# Altium footprint library ref-packages.PCBLIB: 1543 footprints (part 84 of 103)
Each footprint in its own frame and in the unit in brackets; x right, y up, seen from the top. Pads: shape width x height; smd on the part's side, far side on the other; paste and mask are expansions set on the pad; w line width, h text height; cw(c..) or ccw(c..) is an arc to the next point about the centre after c.
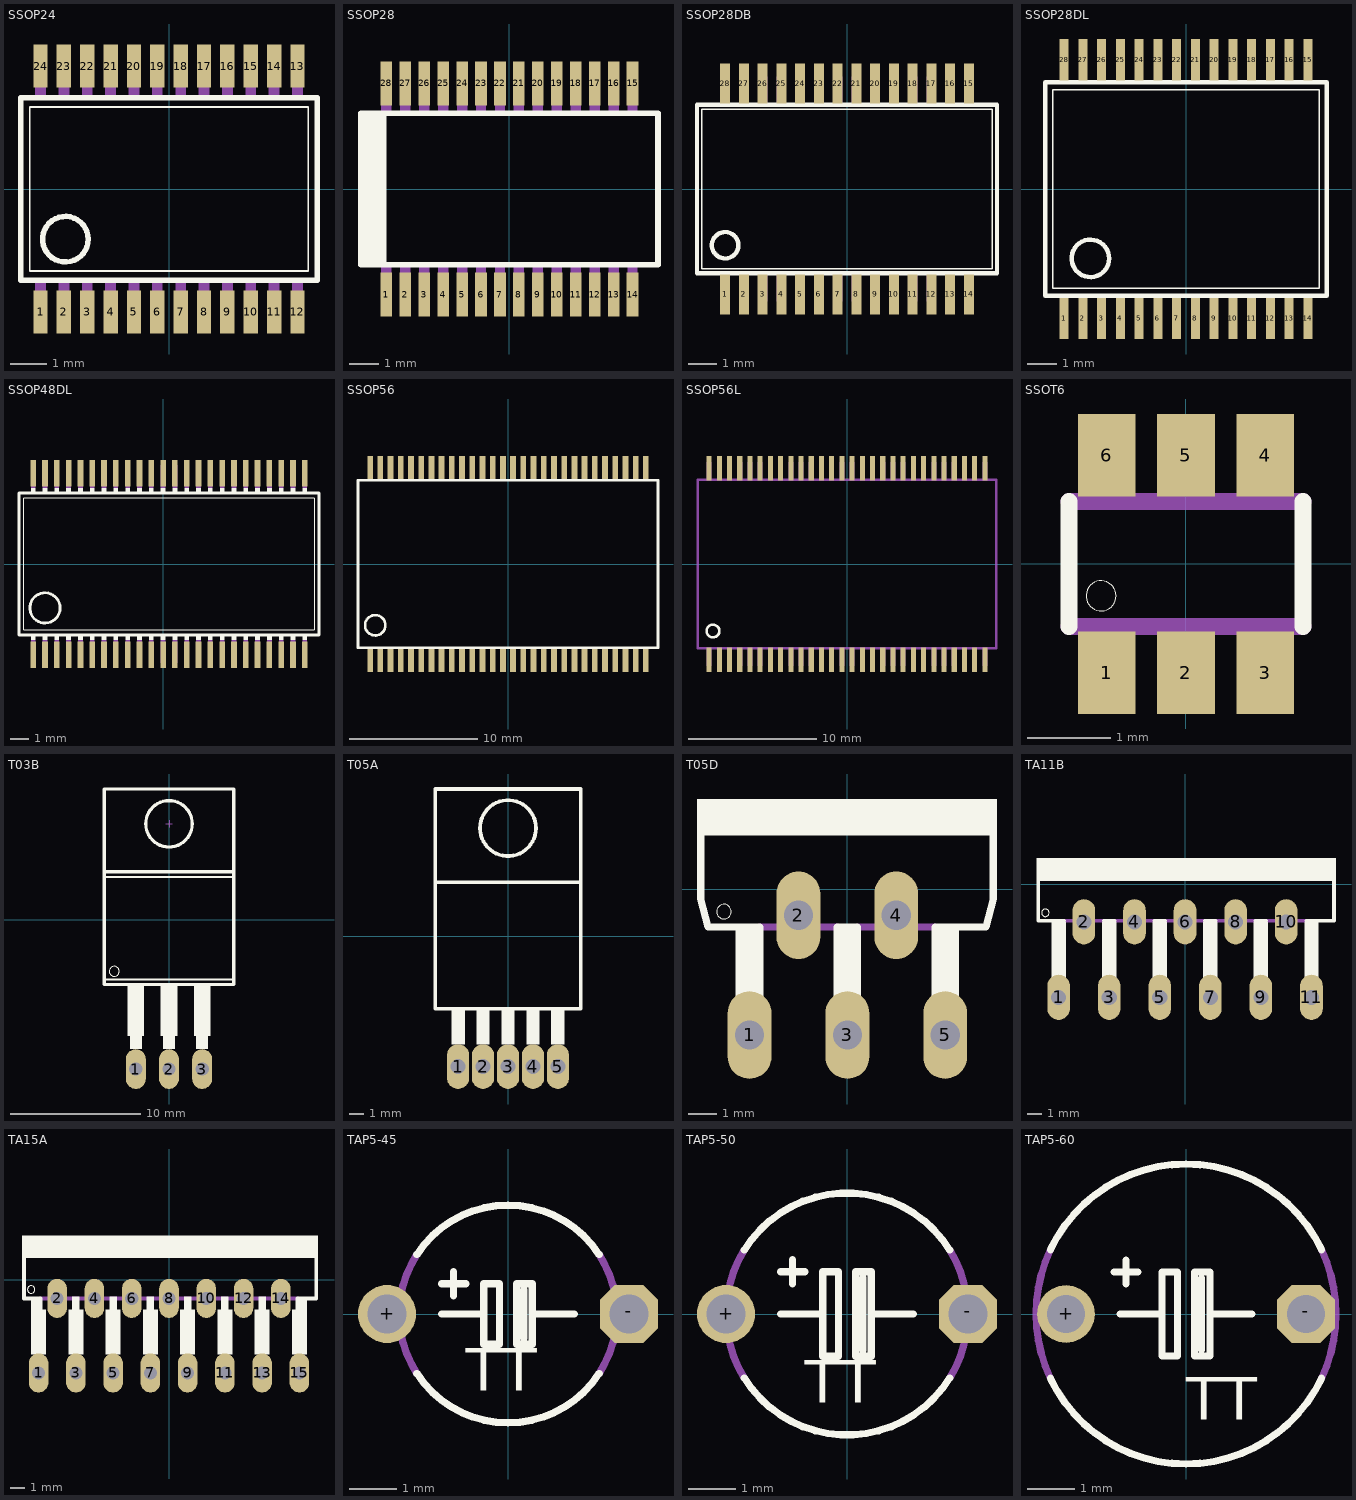
[diagram p83: the footprints below, top view; thin cyan lines are the x and y axes]

## SSOP24 [mil]
pads (24):
  rect 15.75x47.24 smd: 1(-140.75,-134.65) 2(-115.16,-134.65) 3(-89.57,-134.65) 4(-63.98,-134.65) 5(-38.39,-134.65) 6(-12.8,-134.65) 7(12.8,-134.65) 8(38.39,-134.65) 9(63.98,-134.65) 10(89.57,-134.65) 11(115.16,-134.65) 12(140.75,-134.65) 13(140.75,134.65) 14(115.16,134.65) 15(89.57,134.65) 16(63.98,134.65) 17(38.39,134.65) 18(12.8,134.65) 19(-12.8,134.65) 20(-38.39,134.65) 21(-63.98,134.65) 22(-89.57,134.65) 23(-115.16,134.65) 24(-140.75,134.65)
Top Overlay:
  circle w6: c-113.5,-55 r25
  lines w2: -152.52,-90 152.52,-90 152.52,90 -152.52,90 -152.52,-90
  lines w6: -162.52,-99.84 162.52,-99.84 162.52,99.84 -162.52,99.84 -162.52,-99.84
Mechanical 16:
  rectangle: -146.65,-149.61 -134.84,-102.36
  rectangle: -121.06,-149.61 -109.25,-102.36
  rectangle: -95.47,-149.61 -83.66,-102.36
  rectangle: -69.88,-149.61 -58.07,-102.36
  rectangle: -44.29,-149.61 -32.48,-102.36
  rectangle: -18.7,-149.61 -6.89,-102.36
  rectangle: 6.89,-149.61 18.7,-102.36
  rectangle: 32.48,-149.61 44.29,-102.36
  rectangle: 58.07,-149.61 69.88,-102.36
  rectangle: 83.66,-149.61 95.47,-102.36
  rectangle: 109.25,-149.61 121.06,-102.36
  rectangle: 134.84,-149.61 146.65,-102.36
  rectangle: 134.84,102.36 146.65,149.61
  rectangle: 109.25,102.36 121.06,149.61
  rectangle: 83.66,102.36 95.47,149.61
  rectangle: 58.07,102.36 69.88,149.61
  rectangle: 32.48,102.36 44.29,149.61
  rectangle: 6.89,102.36 18.7,149.61
  rectangle: -18.7,102.36 -6.89,149.61
  rectangle: -44.29,102.36 -32.48,149.61
  rectangle: -69.88,102.36 -58.07,149.61
  rectangle: -95.47,102.36 -83.66,149.61
  rectangle: -121.06,102.36 -109.25,149.61
  rectangle: -146.65,102.36 -134.84,149.61

## SSOP28 [mil]
pads (28):
  rect 15.75x59.06 smd: 1(-166.34,-142.72) 2(-140.75,-142.72) 3(-115.16,-142.72) 4(-89.57,-142.72) 5(-63.98,-142.72) 6(-38.39,-142.72) 7(-12.8,-142.72) 8(12.8,-142.72) 9(38.39,-142.72) 10(63.98,-142.72) 11(89.57,-142.72) 12(115.16,-142.72) 13(140.75,-142.72) 14(166.34,-142.72) 15(166.34,142.72) 16(140.75,142.72) 17(115.16,142.72) 18(89.57,142.72) 19(63.98,142.72) 20(38.39,142.72) 21(12.8,142.72) 22(-12.8,142.72) 23(-38.39,142.72) 24(-63.98,142.72) 25(-89.57,142.72) 26(-115.16,142.72) 27(-140.75,142.72) 28(-166.34,142.72)
Top Overlay:
  rectangle: -204.72,-102.36 -166.34,102.36
  lines w8: -200.79,-102.36 200.79,-102.36 200.79,102.36 -200.79,102.36
Mechanical 16:
  rectangle: -173.34,-155 -159.34,-104
  rectangle: -147.75,-155 -133.75,-104
  rectangle: -122.16,-155 -108.16,-104
  rectangle: -96.57,-155 -82.57,-104
  rectangle: -70.98,-155 -56.98,-104
  rectangle: -45.39,-155 -31.39,-104
  rectangle: -19.8,-155 -5.8,-104
  rectangle: 5.8,-155 19.8,-104
  rectangle: 31.39,-155 45.39,-104
  rectangle: 56.98,-155 70.98,-104
  rectangle: 82.57,-155 96.57,-104
  rectangle: 108.16,-155 122.16,-104
  rectangle: 133.75,-155 147.75,-104
  rectangle: 159.34,-155 173.34,-104
  rectangle: 159.34,104 173.34,155
  rectangle: 133.75,104 147.75,155
  rectangle: 108.16,104 122.16,155
  rectangle: 82.57,104 96.57,155
  rectangle: 56.98,104 70.98,155
  rectangle: 31.39,104 45.39,155
  rectangle: 5.8,104 19.8,155
  rectangle: -19.8,104 -5.8,155
  rectangle: -45.39,104 -31.39,155
  rectangle: -70.98,104 -56.98,155
  rectangle: -96.57,104 -82.57,155
  rectangle: -122.16,104 -108.16,155
  rectangle: -147.75,104 -133.75,155
  rectangle: -173.34,104 -159.34,155

## SSOP28DB [mil]
pads (28):
  rect 13.7x55 smd: 1(-166.34,-143.94) 2(-140.75,-143.94) 3(-115.16,-143.94) 4(-89.57,-143.94) 5(-63.98,-143.94) 6(-38.39,-143.94) 7(-12.8,-143.94) 8(12.8,-143.94) 9(38.39,-143.94) 10(63.98,-143.94) 11(89.57,-143.94) 12(115.16,-143.94) 13(140.75,-143.94) 14(166.34,-143.94) 15(166.34,143.94) 16(140.75,143.94) 17(115.16,143.94) 18(89.57,143.94) 19(63.98,143.94) 20(38.39,143.94) 21(12.8,143.94) 22(-12.8,143.94) 23(-38.39,143.94) 24(-63.98,143.94) 25(-89.57,143.94) 26(-115.16,143.94) 27(-140.75,143.94) 28(-166.34,143.94)
Top Overlay:
  circle w6: c-166.34,-76.77 r18.09
  lines w2: -198.35,-108.78 198.35,-108.78 198.35,108.78 -198.35,108.78 -198.35,-108.78
  lines w6: -204.72,-115.16 204.72,-115.16 204.72,115.16 -204.72,115.16 -204.72,-115.16
Mechanical 16:
  rectangle: -172.74,116.76 -159.94,153.54
  rectangle: -172.74,-153.54 -159.94,-116.76
  rectangle: -147.15,-153.54 -134.35,-116.76
  rectangle: -121.56,-153.54 -108.76,-116.76
  rectangle: -147.15,116.76 -134.35,153.54
  rectangle: -121.56,116.76 -108.76,153.54
  rectangle: -95.96,116.76 -83.17,153.54
  rectangle: -70.37,116.76 -57.58,153.54
  rectangle: -44.78,116.76 -31.99,153.54
  rectangle: -19.19,116.76 -6.4,153.54
  rectangle: 6.4,116.76 19.19,153.54
  rectangle: 31.99,116.76 44.78,153.54
  rectangle: 57.58,116.76 70.37,153.54
  rectangle: 83.17,116.76 95.96,153.54
  rectangle: 108.76,116.76 121.56,153.54
  rectangle: 134.35,116.76 147.15,153.54
  rectangle: 159.94,116.76 172.74,153.54
  rectangle: -95.96,-153.54 -83.17,-116.76
  rectangle: -70.37,-153.54 -57.58,-116.76
  rectangle: -44.78,-153.54 -31.99,-116.76
  rectangle: -19.19,-153.54 -6.4,-116.76
  rectangle: 6.4,-153.54 19.19,-116.76
  rectangle: 31.99,-153.54 44.78,-116.76
  rectangle: 57.58,-153.54 70.37,-116.76
  rectangle: 83.17,-153.54 95.96,-116.76
  rectangle: 108.76,-153.54 121.56,-116.76
  rectangle: 134.35,-153.54 147.15,-116.76
  rectangle: 159.94,-153.54 172.74,-116.76

## SSOP28DL [mil]
pads (28):
  rect 12x55 smd: 1(-162.5,-172.5) 2(-137.5,-172.5) 3(-112.5,-172.5) 4(-87.5,-172.5) 5(-62.5,-172.5) 6(-37.5,-172.5) 7(-12.5,-172.5) 8(12.5,-172.5) 9(37.5,-172.5) 10(62.5,-172.5) 11(87.5,-172.5) 12(112.5,-172.5) 13(137.5,-172.5) 14(162.5,-172.5) 15(162.5,172.5) 16(137.5,172.5) 17(112.5,172.5) 18(87.5,172.5) 19(62.5,172.5) 20(37.5,172.5) 21(12.5,172.5) 22(-12.5,172.5) 23(-37.5,172.5) 24(-62.5,172.5) 25(-87.5,172.5) 26(-112.5,172.5) 27(-137.5,172.5) 28(-162.5,172.5)
Top Overlay:
  circle w6: c-127.5,-92.5 r25
  lines w2: -177.52,-132.52 177.52,-132.52 177.52,132.52 -177.52,132.52 -177.52,-132.52
  lines w6: -187.52,-142.52 187.52,-142.52 187.52,142.52 -187.52,142.52 -187.52,-142.52
Mechanical 16:
  rectangle: -166.5,144.5 -158.5,177.5
  rectangle: -141.5,144.5 -133.5,177.5
  rectangle: -116.5,144.5 -108.5,177.5
  rectangle: -91.5,144.5 -83.5,177.5
  rectangle: -66.5,144.5 -58.5,177.5
  rectangle: -41.5,144.5 -33.5,177.5
  rectangle: -16.5,144.5 -8.5,177.5
  rectangle: 8.5,144.5 16.5,177.5
  rectangle: 33.5,144.5 41.5,177.5
  rectangle: 58.5,144.5 66.5,177.5
  rectangle: 83.5,144.5 91.5,177.5
  rectangle: 108.5,144.5 116.5,177.5
  rectangle: 133.5,144.5 141.5,177.5
  rectangle: 158.5,144.5 166.5,177.5
  rectangle: 158.5,-177.5 166.5,-144.5
  rectangle: 133.5,-177.5 141.5,-144.5
  rectangle: 108.5,-177.5 116.5,-144.5
  rectangle: 83.5,-177.5 91.5,-144.5
  rectangle: 58.5,-177.5 66.5,-144.5
  rectangle: 33.5,-177.5 41.5,-144.5
  rectangle: 8.5,-177.5 16.5,-144.5
  rectangle: -16.5,-177.5 -8.5,-144.5
  rectangle: -41.5,-177.5 -33.5,-144.5
  rectangle: -66.5,-177.5 -58.5,-144.5
  rectangle: -91.5,-177.5 -83.5,-144.5
  rectangle: -116.5,-177.5 -108.5,-144.5
  rectangle: -141.5,-177.5 -133.5,-144.5
  rectangle: -166.5,-177.5 -158.5,-144.5

## SSOP48DL [mil]
pads (48):
  rect 12x56 smd: 1(-275,-192) 2(-250,-192) 3(-225,-192) 4(-200,-192) 5(-175,-192) 6(-150,-192) 7(-125,-192) 8(-100,-192) 9(-75,-192) 10(-50,-192) 11(-25,-192) 12(0,-192) 13(25,-192) 14(50,-192) 15(75,-192) 16(100,-192) 17(125,-192) 18(150,-192) 19(175,-192) 20(200,-192) 21(225,-192) 22(250,-192) 23(275,-192) 24(300,-192) 25(300,192) 26(275,192) 27(250,192) 28(225,192) 29(200,192) 30(175,192) 31(150,192) 32(125,192) 33(100,192) 34(75,192) 35(50,192) 36(25,192) 37(0,192) 38(-25,192) 39(-50,192) 40(-75,192) 41(-100,192) 42(-125,192) 43(-150,192) 44(-175,192) 45(-200,192) 46(-225,192) 47(-250,192) 48(-275,192)
Top Overlay:
  circle w6: c-250,-93 r32
  rectangle: -5,-161 5,-150
  rectangle: 20,-161 30,-150
  rectangle: 45,-161 55,-150
  rectangle: 70,-161 80,-150
  rectangle: 95,-161 105,-150
  rectangle: 120,-161 130,-150
  rectangle: 145,-161 155,-150
  rectangle: 170,-161 180,-150
  rectangle: 195,-161 205,-150
  rectangle: 220,-161 230,-150
  rectangle: 245,-161 255,-150
  rectangle: 270,-161 280,-150
  rectangle: -30,-161 -20,-150
  rectangle: -55,-161 -45,-150
  rectangle: -80,-161 -70,-150
  rectangle: -105,-161 -95,-150
  rectangle: -130,-161 -120,-150
  rectangle: -155,-161 -145,-150
  rectangle: -180,-161 -170,-150
  rectangle: -205,-161 -195,-150
  rectangle: -230,-161 -220,-150
  rectangle: -255,-161 -245,-150
  rectangle: -280,-161 -270,-150
  rectangle: -5,150 5,161
  rectangle: -280,150 -270,161
  rectangle: -255,150 -245,161
  rectangle: -230,150 -220,161
  rectangle: -205,150 -195,161
  rectangle: -180,150 -170,161
  rectangle: -155,150 -145,161
  rectangle: -130,150 -120,161
  rectangle: -105,150 -95,161
  rectangle: -80,150 -70,161
  rectangle: -55,150 -45,161
  rectangle: -30,150 -20,161
  rectangle: 20,150 30,161
  rectangle: 45,150 55,161
  rectangle: 70,150 80,161
  rectangle: 95,150 105,161
  rectangle: 120,150 130,161
  rectangle: 145,150 155,161
  rectangle: 170,150 180,161
  rectangle: 195,150 205,161
  rectangle: 220,150 230,161
  rectangle: 245,150 255,161
  rectangle: 270,150 280,161
  rectangle: 295,150 305,161
  rectangle: 295,-161 305,-150
  lines w2: -295,-139 320,-139 320,139 -295,139 -295,-139
  lines w6: -305,-150 330,-150 330,150 -305,150 -305,-150
Mechanical 16:
  rectangle: -5,-210 5,-161
  rectangle: -255,-210 -245,-161
  rectangle: -230,-210 -220,-161
  rectangle: -205,-210 -195,-161
  rectangle: -180,-210 -170,-161
  rectangle: -155,-210 -145,-161
  rectangle: -130,-210 -120,-161
  rectangle: -105,-210 -95,-161
  rectangle: -80,-210 -70,-161
  rectangle: -55,-210 -45,-161
  rectangle: -30,-210 -20,-161
  rectangle: -280,-210 -270,-161
  rectangle: 20,-210 30,-161
  rectangle: 45,-210 55,-161
  rectangle: 70,-210 80,-161
  rectangle: 95,-210 105,-161
  rectangle: 120,-210 130,-161
  rectangle: 145,-210 155,-161
  rectangle: 170,-210 180,-161
  rectangle: 195,-210 205,-161
  rectangle: 220,-210 230,-161
  rectangle: 245,-210 255,-161
  rectangle: 270,-210 280,-161
  rectangle: 295,-210 305,-161
  rectangle: -5,161 5,210
  rectangle: -280,161 -270,210
  rectangle: -255,161 -245,210
  rectangle: -230,161 -220,210
  rectangle: -205,161 -195,210
  rectangle: -180,161 -170,210
  rectangle: -155,161 -145,210
  rectangle: -130,161 -120,210
  rectangle: -105,161 -95,210
  rectangle: -80,161 -70,210
  rectangle: -55,161 -45,210
  rectangle: -30,161 -20,210
  rectangle: 20,161 30,210
  rectangle: 45,161 55,210
  rectangle: 70,161 80,210
  rectangle: 95,161 105,210
  rectangle: 120,161 130,210
  rectangle: 145,161 155,210
  rectangle: 170,161 180,210
  rectangle: 195,161 205,210
  rectangle: 220,161 230,210
  rectangle: 245,161 255,210
  rectangle: 270,161 280,210
  rectangle: 295,161 305,210

## SSOP56 [mm]
pads (56):
  rect 0.45x1.8 smd: 1(-10.8,-7.55) 2(-10,-7.55) 3(-9.2,-7.55) 4(-8.4,-7.55) 5(-7.6,-7.55) 6(-6.8,-7.55) 7(-6,-7.55) 8(-5.2,-7.55) 9(-4.4,-7.55) 10(-3.6,-7.55) 11(-2.8,-7.55) 12(-2,-7.55) 13(-1.2,-7.55) 14(-0.4,-7.55) 15(0.4,-7.55) 16(1.2,-7.55) 17(2,-7.55) 18(2.8,-7.55) 19(3.6,-7.55) 20(4.4,-7.55) 21(5.2,-7.55) 22(6,-7.55) 23(6.8,-7.55) 24(7.6,-7.55) 25(8.4,-7.55) 26(9.2,-7.55) 27(10,-7.55) 28(10.8,-7.55) 29(10.8,7.55) 30(10,7.55) 31(9.2,7.55) 32(8.4,7.55) 33(7.6,7.55) 34(6.8,7.55) 35(6,7.55) 36(5.2,7.55) 37(4.4,7.55) 38(3.6,7.55) 39(2.8,7.55) 40(2,7.55) 41(1.2,7.55) 42(0.4,7.55) 43(-0.4,7.55) 44(-1.2,7.55) 45(-2,7.55) 46(-2.8,7.55) 47(-3.6,7.55) 48(-4.4,7.55) 49(-5.2,7.55) 50(-6,7.55) 51(-6.8,7.55) 52(-7.6,7.55) 53(-8.4,7.55) 54(-9.2,7.55) 55(-10,7.55) 56(-10.8,7.55)
Top Overlay:
  circle w0.203: c-10.4,-4.8 r0.8
  lines w0.203: -11.75,-6.55 11.75,-6.55 11.75,6.55 -11.75,6.55 -11.75,-6.55
Mechanical 16:
  rectangle: -10.95,-8 -10.65,-6.6
  rectangle: -10.15,-8 -9.85,-6.6
  rectangle: -9.35,-8 -9.05,-6.6
  rectangle: -8.55,-8 -8.25,-6.6
  rectangle: -7.75,-8 -7.45,-6.6
  rectangle: -6.95,-8 -6.65,-6.6
  rectangle: -6.15,-8 -5.85,-6.6
  rectangle: -5.35,-8 -5.05,-6.6
  rectangle: -4.55,-8 -4.25,-6.6
  rectangle: -3.75,-8 -3.45,-6.6
  rectangle: -2.95,-8 -2.65,-6.6
  rectangle: -2.15,-8 -1.85,-6.6
  rectangle: -1.35,-8 -1.05,-6.6
  rectangle: -0.55,-8 -0.25,-6.6
  rectangle: 0.25,-8 0.55,-6.6
  rectangle: 1.05,-8 1.35,-6.6
  rectangle: 1.85,-8 2.15,-6.6
  rectangle: 2.65,-8 2.95,-6.6
  rectangle: 3.45,-8 3.75,-6.6
  rectangle: 4.25,-8 4.55,-6.6
  rectangle: 5.05,-8 5.35,-6.6
  rectangle: 5.85,-8 6.15,-6.6
  rectangle: 6.65,-8 6.95,-6.6
  rectangle: 7.45,-8 7.75,-6.6
  rectangle: 8.25,-8 8.55,-6.6
  rectangle: 9.05,-8 9.35,-6.6
  rectangle: 9.85,-8 10.15,-6.6
  rectangle: 10.65,-8 10.95,-6.6
  rectangle: 10.65,6.6 10.95,8
  rectangle: 9.85,6.6 10.15,8
  rectangle: 9.05,6.6 9.35,8
  rectangle: 8.25,6.6 8.55,8
  rectangle: 7.45,6.6 7.75,8
  rectangle: 6.65,6.6 6.95,8
  rectangle: 5.85,6.6 6.15,8
  rectangle: 5.05,6.6 5.35,8
  rectangle: 4.25,6.6 4.55,8
  rectangle: 3.45,6.6 3.75,8
  rectangle: 2.65,6.6 2.95,8
  rectangle: 1.85,6.6 2.15,8
  rectangle: 1.05,6.6 1.35,8
  rectangle: 0.25,6.6 0.55,8
  rectangle: -0.55,6.6 -0.25,8
  rectangle: -1.35,6.6 -1.05,8
  rectangle: -2.15,6.6 -1.85,8
  rectangle: -2.95,6.6 -2.65,8
  rectangle: -3.75,6.6 -3.45,8
  rectangle: -4.55,6.6 -4.25,8
  rectangle: -5.35,6.6 -5.05,8
  rectangle: -6.15,6.6 -5.85,8
  rectangle: -6.95,6.6 -6.65,8
  rectangle: -7.75,6.6 -7.45,8
  rectangle: -8.55,6.6 -8.25,8
  rectangle: -9.35,6.6 -9.05,8
  rectangle: -10.15,6.6 -9.85,8
  rectangle: -10.95,6.6 -10.65,8

## SSOP56L [mm]
pads (56):
  rect 0.4x1.9 smd: 1(-10.8,-7.5) 2(-10,-7.5) 3(-9.2,-7.5) 4(-8.4,-7.5) 5(-7.6,-7.5) 6(-6.8,-7.5) 7(-6,-7.5) 8(-5.2,-7.5) 9(-4.4,-7.5) 10(-3.6,-7.5) 11(-2.8,-7.5) 12(-2,-7.5) 13(-1.2,-7.5) 14(-0.4,-7.5) 15(0.4,-7.5) 16(1.2,-7.5) 17(2,-7.5) 18(2.8,-7.5) 19(3.6,-7.5) 20(4.4,-7.5) 21(5.2,-7.5) 22(6,-7.5) 23(6.8,-7.5) 24(7.6,-7.5) 25(8.4,-7.5) 26(9.2,-7.5) 27(10,-7.5) 28(10.8,-7.5) 29(10.8,7.5) 30(10,7.5) 31(9.2,7.5) 32(8.4,7.5) 33(7.6,7.5) 34(6.8,7.5) 35(6,7.5) 36(5.2,7.5) 37(4.4,7.5) 38(3.6,7.5) 39(2.8,7.5) 40(2,7.5) 41(1.2,7.5) 42(0.4,7.5) 43(-0.4,7.5) 44(-1.2,7.5) 45(-2,7.5) 46(-2.8,7.5) 47(-3.6,7.5) 48(-4.4,7.5) 49(-5.2,7.5) 50(-6,7.5) 51(-6.8,7.5) 52(-7.6,7.5) 53(-8.4,7.5) 54(-9.2,7.5) 55(-10,7.5) 56(-10.8,7.5)
Top Overlay:
  circle w0.203: c-10.5,-5.25 r0.5
Mechanical 16:
  rectangle: -11,-8 -10.6,-6.6
  rectangle: -10.2,-8 -9.8,-6.6
  rectangle: -9.4,-8 -9,-6.6
  rectangle: -8.6,-8 -8.2,-6.6
  rectangle: -7.8,-8 -7.4,-6.6
  rectangle: -7,-8 -6.6,-6.6
  rectangle: -6.2,-8 -5.8,-6.6
  rectangle: -5.4,-8 -5,-6.6
  rectangle: -4.6,-8 -4.2,-6.6
  rectangle: -3.8,-8 -3.4,-6.6
  rectangle: -3,-8 -2.6,-6.6
  rectangle: -2.2,-8 -1.8,-6.6
  rectangle: -1.4,-8 -1,-6.6
  rectangle: -0.6,-8 -0.2,-6.6
  rectangle: 0.2,-8 0.6,-6.6
  rectangle: 1,-8 1.4,-6.6
  rectangle: 1.8,-8 2.2,-6.6
  rectangle: 2.6,-8 3,-6.6
  rectangle: 3.4,-8 3.8,-6.6
  rectangle: 4.2,-8 4.6,-6.6
  rectangle: 5,-8 5.4,-6.6
  rectangle: 5.8,-8 6.2,-6.6
  rectangle: 6.6,-8 7,-6.6
  rectangle: 7.4,-8 7.8,-6.6
  rectangle: 8.2,-8 8.6,-6.6
  rectangle: 9,-8 9.4,-6.6
  rectangle: 9.8,-8 10.2,-6.6
  rectangle: 10.6,-8 11,-6.6
  rectangle: 10.6,6.6 11,8
  rectangle: 9.8,6.6 10.2,8
  rectangle: 9,6.6 9.4,8
  rectangle: 8.2,6.6 8.6,8
  rectangle: 7.4,6.6 7.8,8
  rectangle: 6.6,6.6 7,8
  rectangle: 5.8,6.6 6.2,8
  rectangle: 5,6.6 5.4,8
  rectangle: 4.2,6.6 4.6,8
  rectangle: 3.4,6.6 3.8,8
  rectangle: 2.6,6.6 3,8
  rectangle: 1.8,6.6 2.2,8
  rectangle: 1,6.6 1.4,8
  rectangle: 0.2,6.6 0.6,8
  rectangle: -0.6,6.6 -0.2,8
  rectangle: -1.4,6.6 -1,8
  rectangle: -2.2,6.6 -1.8,8
  rectangle: -3,6.6 -2.6,8
  rectangle: -3.8,6.6 -3.4,8
  rectangle: -4.6,6.6 -4.2,8
  rectangle: -5.4,6.6 -5,8
  rectangle: -6.2,6.6 -5.8,8
  rectangle: -7,6.6 -6.6,8
  rectangle: -7.8,6.6 -7.4,8
  rectangle: -8.6,6.6 -8.2,8
  rectangle: -9.4,6.6 -9,8
  rectangle: -10.2,6.6 -9.8,8
  rectangle: -11,6.6 -10.6,8
  lines w0.203: -11.7,-6.6 -11.7,6.6 11.7,6.6 11.7,-6.6 -11.7,-6.6

## SSOT6 [mil]
pads (6):
  rect 27.17x38.98 smd: 1(-37.4,-51.18) 2(0,-51.18) 3(37.4,-51.18) 4(37.4,51.18) 5(0,51.18) 6(-37.4,51.18)
Top Overlay:
  circle w0: c-40,-15 r7.07
  lines w8: -55.12,-29.53 -55.12,29.53 ; 55.12,-29.53 55.12,29.53
Mechanical 16:
  rectangle: -47.24,-59.06 -27.56,-31.5
  rectangle: -9.84,-59.06 9.84,-31.5
  rectangle: 27.56,-59.06 47.24,-31.5
  region: 47.24,59.06 27.56,59.06 27.56,31.5 47.24,31.5
  region: 9.84,59.06 -9.84,59.06 -9.84,31.5 9.84,31.5
  region: -27.56,59.06 -47.24,59.06 -47.24,31.5 -27.56,31.5
  lines w8: -55.12,-29.53 55.12,-29.53 ; -55.12,29.53 55.12,29.53

## T03B [mil]
pads (3):
  oval 60x120 hole 40: 1(-100,-450) 2(0,-450) 3(100,-450)
Top Overlay:
  circle w0: c-165,-155 r15
  circle w10: c0,290 r70
  rectangle: -125,-350 -75,-198
  rectangle: -118,-390 -82,-348
  rectangle: -25,-350 25,-198
  rectangle: -18,-390 18,-348
  rectangle: 75,-350 125,-198
  rectangle: 82,-390 118,-348
  lines w6: -190,-180 190,-180 ; -190,130 190,130
  lines w10: -195,145 -195,-195 195,-195 195,145 ; -195,145 -195,395 195,395 195,145 ; -195,145 195,145
Mechanical 16:
  lines w2: -10,290 10,290 ; 0,280 0,300

## T05A [mil]
pads (5):
  oval 60x120 hole 40: 1(-134,-350) 2(-67,-350) 3(0,-350) 4(67,-350) 5(134,-350)
Top Overlay:
  circle w10: c0,290 r75
  rectangle: -152,-290 -116,-195
  rectangle: -85,-290 -49,-195
  rectangle: -18,-290 18,-195
  rectangle: 49,-290 85,-195
  rectangle: 116,-290 152,-195
  lines w10: -195,145 -195,-195 195,-195 195,145 ; -195,145 195,145 ; -195,145 -195,395 195,395 195,145

## T05D [mil]
pads (5):
  oval 60x120 hole 40: 1(-134,-200) 2(-67,-36) 3(0,-200) 4(67,-36) 5(134,-200)
Top Overlay:
  circle w0: c-169,-31 r10
  rectangle: -206,73 205,123
  rectangle: -153,-152 -115,-53
  rectangle: -19,-152 19,-53
  rectangle: 115,-152 153,-53
  lines w10: -201,79 -201,-13 -191,-52 -120,-52 ; -14,-52 14,-52 ; 120,-52 190,-52 200,-13 200,79
Mechanical 16:
  lines w10: -120,-52 -14,-52 ; 14,-52 120,-52

## TA11B [mil]
pads (11):
  oval 60x120 hole 40: 1(-335,-300) 2(-268,-100) 3(-201,-300) 4(-134,-100) 5(-67,-300) 6(0,-100) 7(67,-300) 8(134,-100) 9(201,-300) 10(268,-100) 11(335,-300)
Top Overlay:
  circle w0: c-370,-76 r10
  rectangle: -354,-252 -316,-100
  rectangle: -220,-252 -182,-100
  rectangle: -86,-252 -48,-100
  rectangle: 48,-252 86,-100
  rectangle: 182,-252 220,-100
  rectangle: 316,-252 354,-100
  rectangle: -394,8 400,69
  lines w10: -389,11 -389,-97 -321,-97 ; -215,-97 -187,-97 ; -81,-97 -53,-97 ; 53,-97 81,-97 ; 187,-97 215,-97 ; 321,-97 395,-97 395,34
Mechanical 16:
  lines w10: -321,-97 -215,-97 ; -187,-97 -81,-97 ; -53,-97 53,-97 ; 81,-97 187,-97 ; 215,-97 321,-97

## TA15A [mil]
pads (15):
  oval 52.5x105 hole 35: 1(-350,-250) 2(-300,-50) 3(-250,-250) 4(-200,-50) 5(-150,-250) 6(-100,-50) 7(-50,-250) 8(0,-50) 9(50,-250) 10(100,-50) 11(150,-250) 12(200,-50) 13(250,-250) 14(300,-50) 15(350,-250)
Top Overlay:
  circle w0: c-370,-26 r10
  rectangle: -394,58 400,119
  rectangle: -370,-85 -340,-50
  rectangle: -370,-200 -330,-80
  rectangle: -270,-200 -230,-80
  rectangle: -260,-90 -240,-45
  rectangle: -170,-200 -130,-80
  rectangle: -160,-90 -140,-45
  rectangle: -70,-200 -30,-80
  rectangle: -60,-90 -40,-45
  rectangle: 30,-200 70,-80
  rectangle: 40,-90 60,-45
  rectangle: 130,-200 170,-80
  rectangle: 140,-90 160,-45
  rectangle: 230,-200 270,-80
  rectangle: 240,-90 260,-45
  rectangle: 340,-85 370,-50
  rectangle: 330,-200 370,-80
  lines w10: -389,61 -389,-50 -345,-50 ; 345,-50 395,-50 395,84
Mechanical 16:
  lines w10: -345,-50 345,-50

## TAP5-45 [mil]
pads (2):
  round 48 hole 32: +(-100,0)
  oct 48x48 hole 32: -(100,0)
Top Overlay:
  lines w6: -75.37,-49.18 ccw(c0,0) 75.37,-49.18 ; -75.37,49.18 cw(c0,0) 75.37,49.18 ; -55,0 -20,0 ; -55,25 -35,25 ; -45,15 -45,35 ; 13,-20 13,20 ; 55,0 20,0 ; -20,0 -20,-25 -7,-25 -7,25 -20,25 -20,0 ; 20,0 20,-25 7,-25 7,25 20,25 20,0
  text "TT" at -35,-75 h60.45
Mechanical 16:
  lines w6: -75.37,-49.18 cw(c0,0) -75.37,49.18 ; 75.37,-49.18 ccw(c0,0) 75.37,49.18

## TAP5-50 [mil]
pads (2):
  round 48 hole 32: +(-100,0)
  oct 48x48 hole 32: -(100,0)
Top Overlay:
  lines w6: -84.87,-52.88 ccw(c0,0) 84.87,-52.88 ; -84.87,52.88 cw(c0,0) 84.87,52.88 ; -55,0 -20,0 ; -55,35 -35,35 ; -45,25 -45,45 ; 13,-30 13,30 ; 55,0 20,0 ; -20,0 -20,-35 -7,-35 -7,35 -20,35 -20,0 ; 20,0 20,-35 7,-35 7,35 20,35 20,0
  text "TT" at -35,-85 h60.45
Mechanical 16:
  lines w6: -84.87,-52.88 cw(c0,0) -84.87,52.88 ; 84.87,-52.88 ccw(c0,0) 84.87,52.88

## TAP5-60 [mil]
pads (2):
  round 48 hole 32: +(-100,0)
  oct 48x48 hole 32: -(100,0)
Top Overlay:
  lines w6: -113,-53.44 ccw(c0,0) 113,-53.44 ; -113,53.44 cw(c0,0) 113,53.44 ; -60,35 -40,35 ; -55,0 -20,0 ; -50,25 -50,45 ; 13,-30 13,30 ; 55,0 20,0 ; -20,0 -20,-35 -7,-35 -7,35 -20,35 -20,0 ; 20,0 20,-35 7,-35 7,35 20,35 20,0
  text "TT" at 0,-100 h60.45
Mechanical 16:
  lines w6: -113,-53.44 cw(c0,0) -113,53.44 ; 113,-53.44 ccw(c0,0) 113,53.44